# Altium footprint library TO系列封装.PcbLib: 129 footprints (part 6 of 9)
Each footprint in its own frame and in the unit in brackets; x right, y up, seen from the top. Pads: shape width x height; smd on the part's side, far side on the other; paste and mask are expansions set on the pad; w line width, h text height; cw(c..) or ccw(c..) is an arc to the next point about the centre after c.
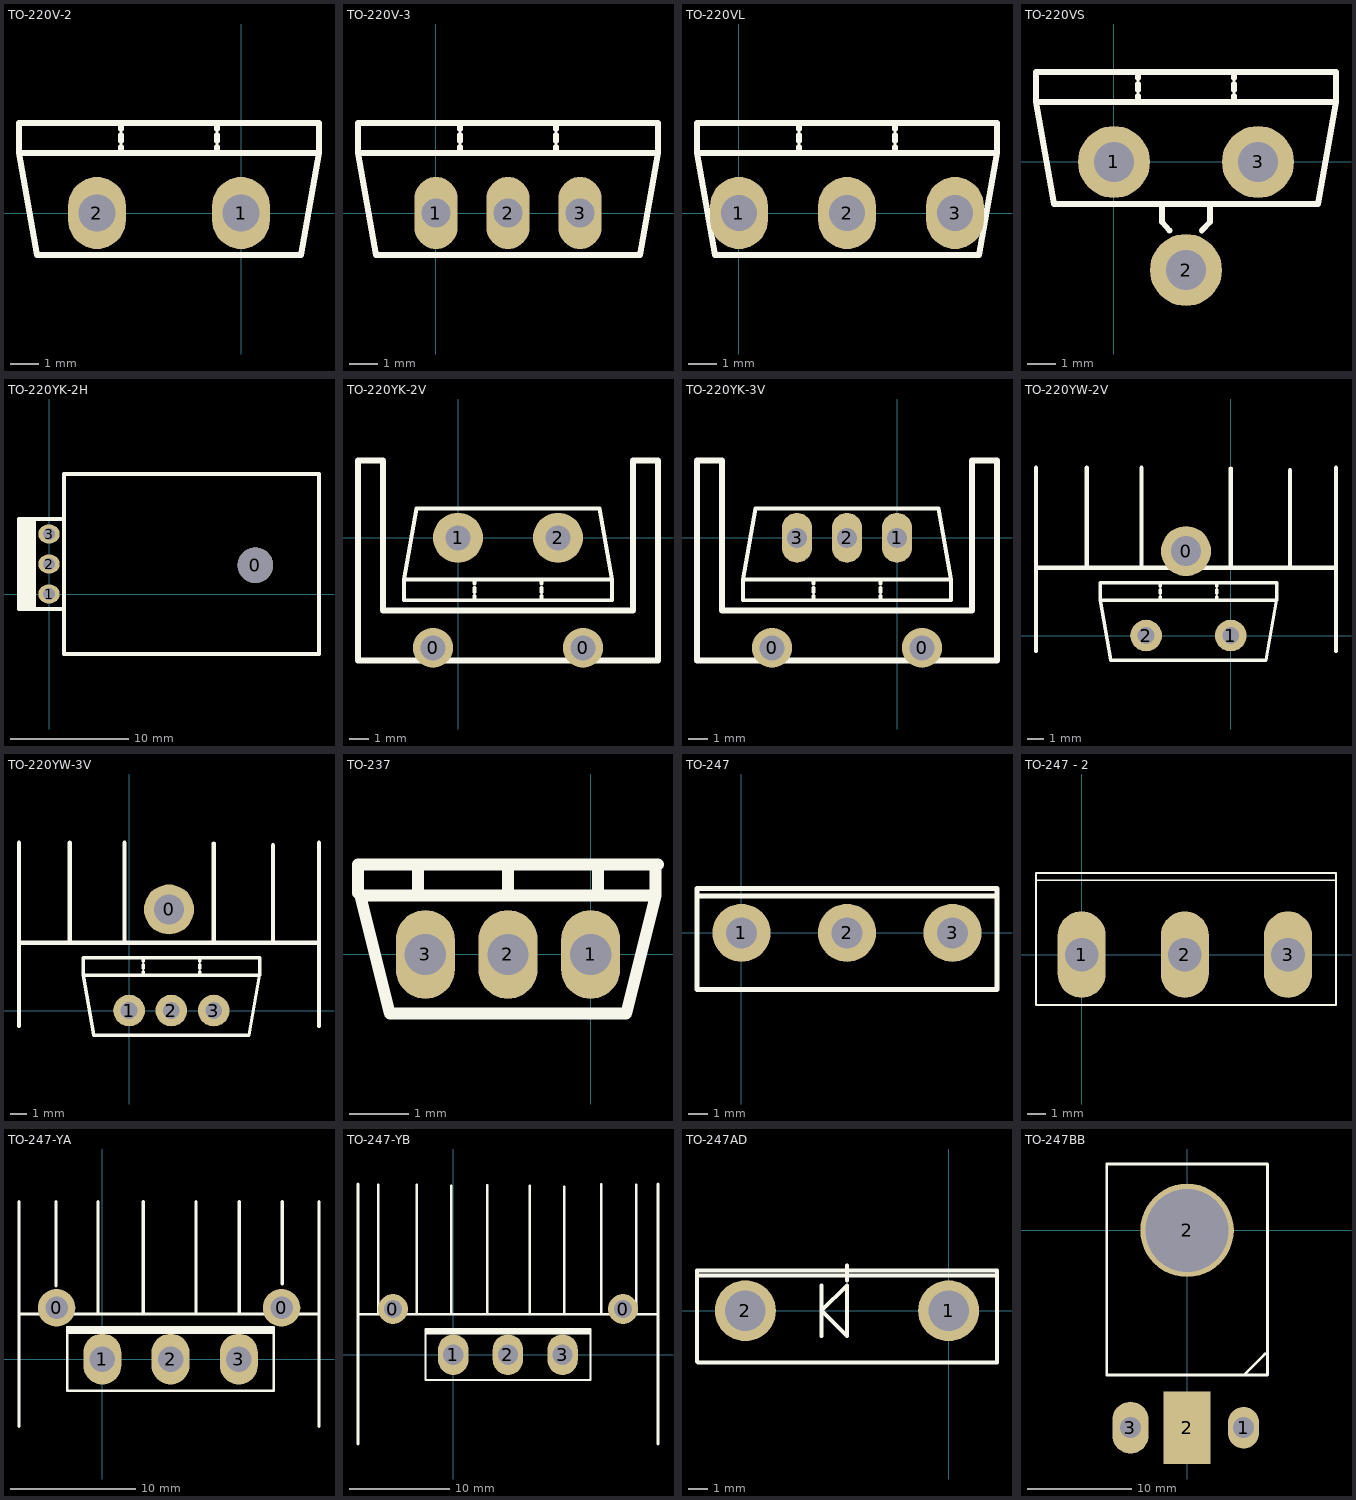
[diagram p5: the footprints below, top view; thin cyan lines are the x and y axes]

## TO-220V-2 [mil]
pads (2):
  oval 80x100 hole 51.18: 1(0,0) 2(-200,0)
Top Overlay:
  lines w7.87: -166.67,83.33 -166.67,91.67 ; -166.67,100 -166.67,108.33 ; -166.67,116.67 -166.67,125 ; -33.33,83.33 -33.33,91.67 ; -33.33,100 -33.33,108.33 ; -33.33,116.67 -33.33,125 ; -308.33,83.33 -308.33,125 108.33,125 108.33,83.33 ; -308.33,83.33 -283.33,-58.33 83.33,-58.33 108.33,83.33 ; -308.33,83.33 108.33,83.33

## TO-220V-3 [mil]
pads (3):
  oval 60x100 hole 40: 1(0,0) 2(100,0) 3(200,0)
Top Overlay:
  lines w7.87: 33.33,83.33 33.33,91.67 ; 33.33,100 33.33,108.33 ; 33.33,116.67 33.33,125 ; 166.67,83.33 166.67,91.67 ; 166.67,100 166.67,108.33 ; 166.67,116.67 166.67,125 ; -108.33,83.33 308.33,83.33 ; -108.33,83.33 -83.33,-58.33 283.33,-58.33 308.33,83.33 ; -108.33,83.33 -108.33,125 308.33,125 308.33,83.33
3D body "User Library-MJF45H11 Transistors PNP TO-220 FULLPAK-3.STEP": height 782.28, standoff -374.02, extent -99.62,-64.42 299.62,121.4

## TO-220VL [mil]
pads (3):
  oval 80x100 hole 50: 1(0,0) 2(150,0) 3(300,0)
Top Overlay:
  lines w7.87: 83.33,83.33 83.33,91.67 ; 83.33,100 83.33,108.33 ; 83.33,116.67 83.33,125 ; 216.67,83.33 216.67,91.67 ; 216.67,100 216.67,108.33 ; 216.67,116.67 216.67,125 ; -58.33,83.33 358.33,83.33 ; -58.33,83.33 -33.33,-58.33 333.33,-58.33 358.33,83.33 ; -58.33,83.33 -58.33,125 358.33,125 358.33,83.33

## TO-220VS [mil]
pads (3):
  round 100 hole 55: 1(0,0) 2(100,-150) 3(200,0)
Top Overlay:
  lines w7.87: 33.33,83.33 33.33,91.67 ; 33.33,100 33.33,108.33 ; 33.33,116.67 33.33,125 ; 66.67,-58.33 66.67,-83.33 77.03,-95.12 ; 122.02,-95.12 133.33,-83.33 133.33,-58.33 ; 166.67,83.33 166.67,91.67 ; 166.67,100 166.67,108.33 ; 166.67,116.67 166.67,125 ; -108.33,83.33 308.33,83.33 ; -108.33,83.33 -83.33,-58.33 283.33,-58.33 308.33,83.33 ; -108.33,83.33 -108.33,125 308.33,125 308.33,83.33
3D body "User Library-MOSFET TO_220.STEP": height 767.72, standoff -401.57, extent -101.85,-130.75 291.85,85

## TO-220YK-2H [mil]
pads (4):
  round 118.11 hole 118.11: 0(688,96)
  oval 71x63 hole 39: 1(0,0) 2(0,100) 3(0,200)
Top Overlay:
  rectangle: -100,-50 -50,250
  lines w12: -50,-50 -50,250 ; -100,-50 50,-50 50,250 -100,250 -100,-50 ; 50,-200 900,-200 900,400 50,400 50,-200

## TO-220YK-2V [mil]
pads (4):
  round 80 hole 50: 0(-50,-220) 0(250,-220)
  round 100 hole 50: 1(0,0) 2(200,0)
Top Overlay:
  lines w7.87: 33.33,-125 33.33,-116.67 ; 33.33,-108.33 33.33,-100 ; 33.33,-91.67 33.33,-83.33 ; 166.67,-125 166.67,-116.67 ; 166.67,-108.33 166.67,-100 ; 166.67,-91.67 166.67,-83.33 ; -108.33,-83.33 -108.33,-125 308.33,-125 308.33,-83.33 ; -108.33,-83.33 308.33,-83.33 ; -108.33,-83.33 -83.33,58.33 283.33,58.33 308.33,-83.33
  lines w12: -200,-245 -200,155 -150,155 -150,-145 350,-145 350,155 400,155 400,-245 -200,-245

## TO-220YK-3V [mil]
pads (5):
  round 80 hole 50: 0(-250,-220) 0(50,-220)
  oval 60x100 hole 40: 1(0,0) 2(-100,0) 3(-200,0)
Top Overlay:
  lines w7.87: -166.67,-125 -166.67,-116.67 ; -166.67,-108.33 -166.67,-100 ; -166.67,-91.67 -166.67,-83.33 ; -33.33,-125 -33.33,-116.67 ; -33.33,-108.33 -33.33,-100 ; -33.33,-91.67 -33.33,-83.33 ; -308.33,-83.33 -308.33,-125 108.33,-125 108.33,-83.33 ; -308.33,-83.33 108.33,-83.33 ; -308.33,-83.33 -283.33,58.33 83.33,58.33 108.33,-83.33
  lines w12: -400,-245 -400,155 -350,155 -350,-145 150,-145 150,155 200,155 200,-245 -400,-245

## TO-220YW-2V [mm]
pads (3):
  round 3 hole 1.8: 0(-2.684,5.064)
  round 1.9 hole 1: 1(0,0) 2(-5.08,0)
Top Overlay:
  lines w0.2: -4.233,2.117 -4.233,2.328 ; -4.233,2.54 -4.233,2.752 ; -4.233,2.963 -4.233,3.175 ; -0.847,2.117 -0.847,2.328 ; -0.847,2.54 -0.847,2.752 ; -0.847,2.963 -0.847,3.175 ; -7.832,2.117 2.752,2.117 ; -7.832,2.117 -7.197,-1.482 2.117,-1.482 2.752,2.117 ; -7.832,2.117 -7.832,3.175 2.752,3.175 2.752,2.117
  lines w0.254: -11.684,-0.936 -11.684,10.064 ; -11.684,4.064 6.316,4.064 ; -8.636,4.064 -8.636,10.064 ; -5.362,4.208 -5.362,10.064 ; 0,4.064 0,10.029 ; 3.556,4.064 3.556,9.92 ; 6.316,-0.936 6.316,10.064

## TO-220YW-3V [mm]
pads (4):
  round 3 hole 1.8: 0(2.396,6.064)
  round 1.9 hole 1: 1(0,0) 2(2.54,0) 3(5.08,0)
Top Overlay:
  lines w0.2: 0.847,2.117 0.847,2.328 ; 0.847,2.54 0.847,2.752 ; 0.847,2.963 0.847,3.175 ; 4.233,2.117 4.233,2.328 ; 4.233,2.54 4.233,2.752 ; 4.233,2.963 4.233,3.175 ; -2.752,2.117 7.832,2.117 ; -2.752,2.117 -2.117,-1.482 7.197,-1.482 7.832,2.117 ; -2.752,2.117 -2.752,3.175 7.832,3.175 7.832,2.117
  lines w0.254: -6.604,-0.936 -6.604,10.064 ; -6.604,4.064 11.396,4.064 ; -3.556,4.064 -3.556,10.064 ; -0.282,4.208 -0.282,10.064 ; 5.08,4.064 5.08,10.029 ; 8.636,4.064 8.636,9.92 ; 11.396,-0.936 11.396,10.064
3D body "User Library-TO220-AB PCB.STEP": height 20.05, standoff -3.5, extent -2.664,-1.651 7.236,2.806
3D body "User Library-heat sink-1.STEP": height 30.62, standoff 0, extent -9.037,-3.827 13.863,12.573

## TO-237 [mm]
pads (3):
  oval 1x1.5 hole 0.7: 1(0,0) 2(-1.4,0) 3(-2.8,0)
Top Overlay:
  lines w0.2: -2.924,1 -2.924,1.524 ; -1.4,1 -1.4,1.524 ; 0.124,1 0.124,1.524 ; -3.9,1 -3.4,-1 0.6,-1 1.1,1 ; -3.9,1 1.1,1 ; -3.9,1 -3.94,1.04 -3.94,1.524 1.14,1.524 1.1,1.484 1.1,1

## TO-247 [mm]
height 0.9
pads (3):
  round 3 hole 1.6: 1(0,0) 2(5.45,0) 3(10.9,0)
Top Overlay:
  lines w0.254: -2.297,1.905 13.07,1.905 ; -2.297,-2.921 13.197,-2.921 13.197,2.286 -2.297,2.286 -2.297,-2.921
3D body "TO247.STEP": height 26.16, standoff -15.75, extent -2.644,-3.192 13.616,2.108

## TO-247 - 2 [mil]
pads (3):
  oval 100x180 hole 70: 1(0,0) 2(215,0) 3(430,0)
Top Overlay:
  lines w3.94: -95,155 530,155 ; -95,-105 530,-105 530,170 -95,170 -95,-105
3D body "User Library-IRFP2907.step": height 984.25, standoff -387.64, extent -90.12,-98.43 520.12,98.43

## TO-247-YA [mil]
pads (5):
  round 118.11 hole 70.87: 0(-144.29,161.42) 0(564.37,161.42)
  oval 120x160 hole 80: 1(0,0) 2(215,0) 3(430,0)
Top Overlay:
  lines w7.87: -110,83.33 540,83.33 ; -110,86.67 540,86.67 ; -110,91.67 540,91.67 ; -110,95 540,95 ; -110,-100 540,-100 540,100 -110,100 -110,-100
  lines w10: -262.4,-212.32 -262.4,496.34 ; -262.4,141.73 682.48,141.73 ; -145.39,230.94 -145.39,496.34 ; -13.5,147.4 -13.5,496.34 ; 128.94,141.73 128.94,496.34 ; 295.12,143.11 295.12,496.34 ; 431.1,147.4 431.1,496.34 ; 566.77,236.57 566.77,496.34 ; 682.48,-212.32 682.48,496.34
3D body "User Library-TO_247.STEP": height 1102.36, standoff -316.86, extent -101.02,-100 521.02,109.06

## TO-247-YB [mil]
pads (5):
  round 118.11 hole 70.87: 0(-237.64,179.29) 0(667.87,179.29)
  oval 120x160 hole 80: 1(0,0) 2(215,0) 3(430,0)
Top Overlay:
  lines w7.87: -110,83.33 540,83.33 ; -110,86.67 540,86.67 ; -110,91.67 540,91.67 ; -110,95 540,95 ; 6.79,82.94 423.45,82.94 ; 148.45,82.94 148.45,91.27 ; -110,-100 -110,100 540,100 540,-100 -110,-100
  lines w10: -375.43,-351.93 -375.43,671.69 ; -375.43,159.61 805.67,159.61 ; -295.47,167.44 -295.47,668.19 ; -144.41,159.61 -144.41,668.15 ; -8.43,165.28 -8.43,663.9 ; 134.02,159.61 134.02,665.98 ; 300.2,160.98 300.2,663.86 ; 436.18,165.28 436.18,661.65 ; 582.91,165.28 582.91,670.32 ; 720,159.61 720,669.25 ; 805.67,-351.93 805.67,671.69
3D body "User Library-Heat Sink 6400BG.STEP": height 2559.06, standoff -118.11, extent -683.54,-370 970,630
3D body "User Library-TO_247.STEP": height 1062.99, standoff -356.23, extent -97.05,-70 525,139.06

## TO-247AD [mil]
pads (2):
  round 120 hole 80: 1(0,0) 2(-400,0)
Top Overlay:
  lines w7.87: -200,59.05 -200,88.58 -200,78.74 ; 95.28,68.9 -495.28,68.9 -495.28,-100 ; -495.28,-100 -493.7,-101.58 95.28,-101.58 95.28,78.74 -495.28,78.74 -495.28,-100
  lines w8: -250,-50 -250,50 ; 95.28,-101.58 95.28,68.9 ; -250,0 -200,50 -200,-50 -250,0
3D body "User Library-IRFP2907.STEP": height 1062.99, standoff -308.9, extent -500.12,-121.85 110.12,75

## TO-247BB [mm]
pads (4):
  oval 3x4 hole 2.032: 1(5.45,-19)
  rect 4.5x7 all layers, no hole: 2(0,-19)
  round 9 hole 8: 2(0,0)
  oval 3.5x5 hole 2.032: 3(-5.45,-19)
Top Overlay:
  lines w0.254: 5.461,-13.927 7.493,-11.895 7.747,-11.895 ; -7.747,-13.927 7.747,-13.927 7.747,6.393 -7.747,6.393 -7.747,-13.927
3D body "User Library-TO-247H.STEP": height 3.9, standoff -8, extent -8.004,-19.138 7.496,6.262